# Altium footprint library HidroanaPCBLib1.PcbLib: 88 footprints (part 3 of 6)
Each footprint in its own frame and in the unit in brackets; x right, y up, seen from the top. Pads: shape width x height; smd on the part's side, far side on the other; paste and mask are expansions set on the pad; w line width, h text height; cw(c..) or ccw(c..) is an arc to the next point about the centre after c.
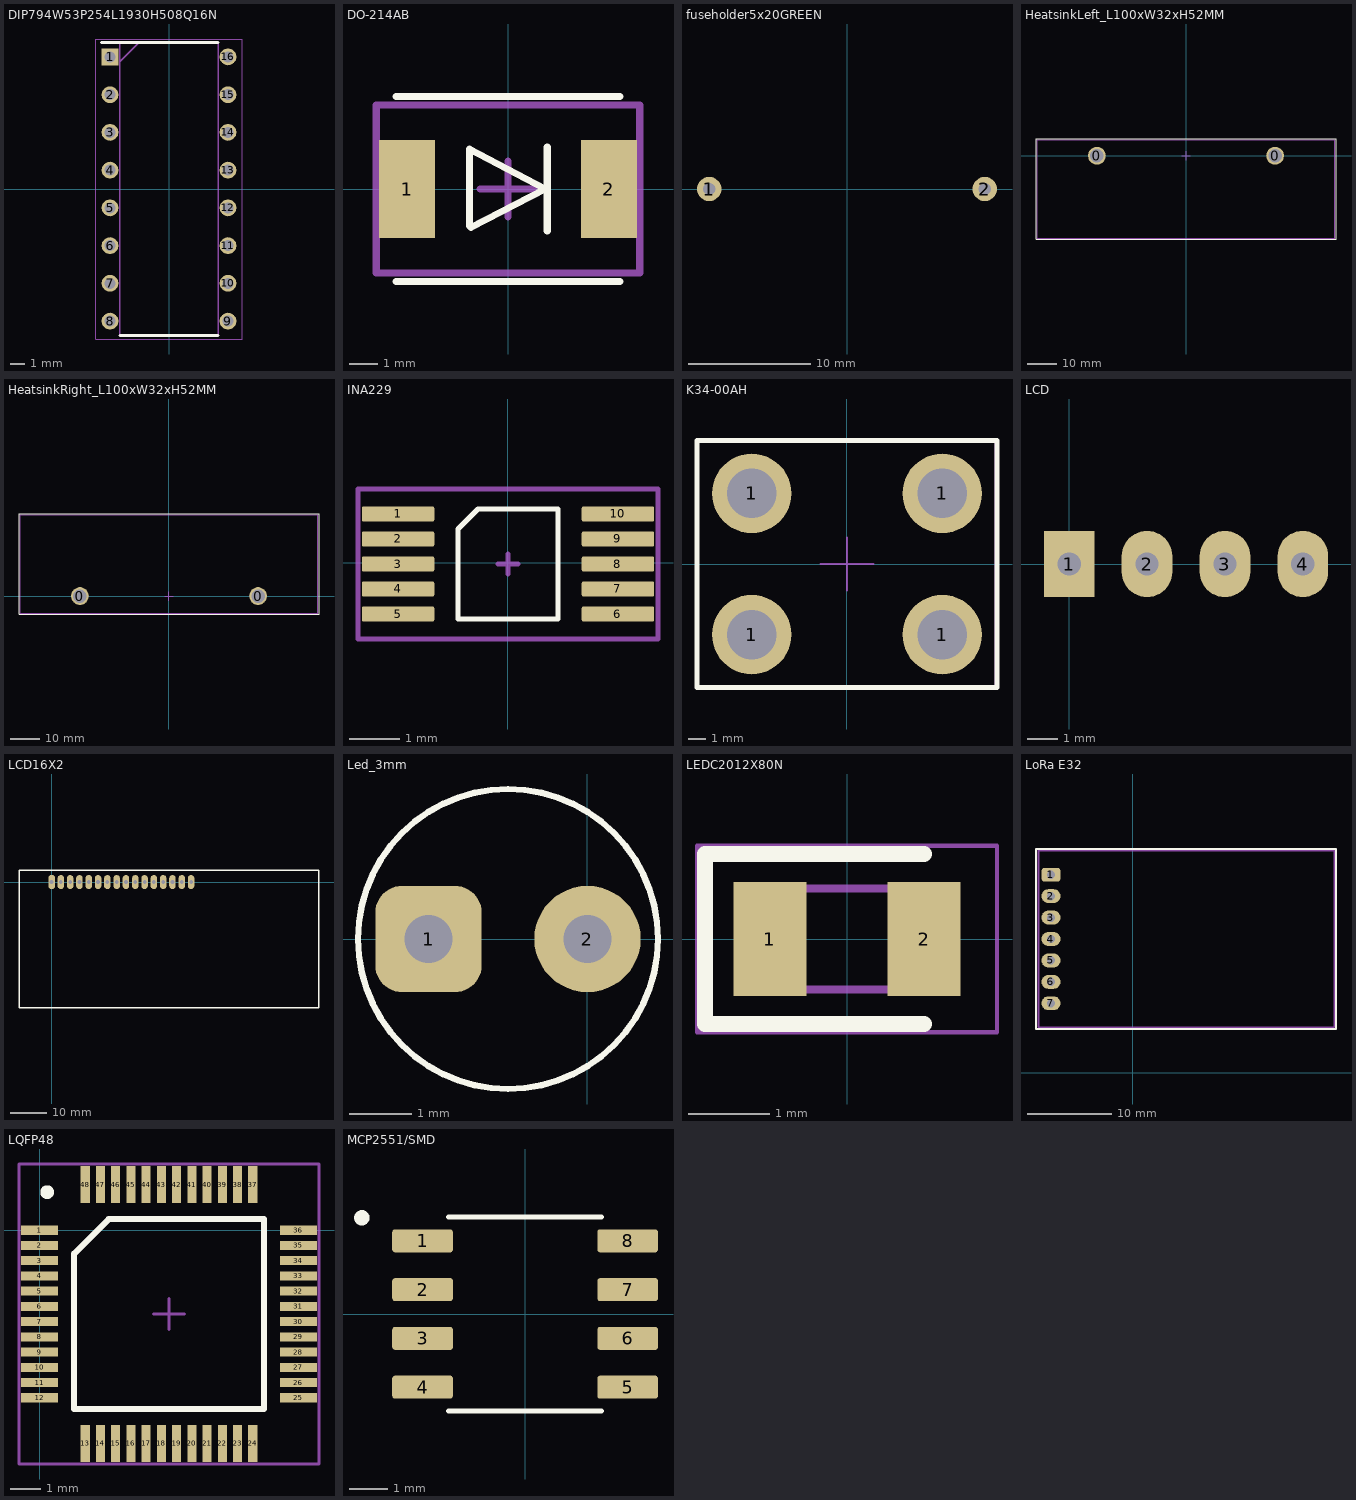
[diagram p2: the footprints below, top view; thin cyan lines are the x and y axes]

## DIP794W53P254L1930H508Q16N [mm]
pads (16):
  rect 1.13x1.13 hole 0.73: 1(-3.97,8.89)
  round 1.13 hole 0.73: 2(-3.97,6.35) 3(-3.97,3.81) 4(-3.97,1.27) 5(-3.97,-1.27) 6(-3.97,-3.81) 7(-3.97,-6.35) 8(-3.97,-8.89) 9(3.97,-8.89) 10(3.97,-6.35) 11(3.97,-3.81) 12(3.97,-1.27) 13(3.97,1.27) 14(3.97,3.81) 15(3.97,6.35) 16(3.97,8.89)
Top Overlay:
  lines w0.2: -4.535,9.845 3.3,9.845 ; -3.3,-9.845 3.3,-9.845
Top Component Center:
  lines w0.05: -4.945,-10.095 -4.945,10.095 4.945,10.095 4.945,-10.095 -4.945,-10.095
  lines w0.1: -3.3,8.575 -2.03,9.845 ; -3.3,-9.845 -3.3,9.845 3.3,9.845 3.3,-9.845 -3.3,-9.845
Top Designator:
  text ".Designator" at -7.364,-0.508 h1.52
3D body "TL494CN.stp": height 5.27, standoff -3.1, extent -3.937,-9.842 3.937,9.842

## Distance 11mm [mm]
via 0,0 diameter 3.2 hole 3.2
3D body "Download_STEP_970110321 (rev1).stp": height 11, standoff 0, extent -3.175,-2.75 3.176,2.75

## DO-214AB [mm]
pads (2):
  rect 2x3.5 smd mask+0.05: 1(-3.6,0) 2(3.6,0)
Top Overlay:
  lines w0.254: -4,-3.3 4,-3.3 ; -4,3.3 4,3.3 ; -1.375,-1.325 -1.375,1.425 1.325,0 -1.325,-1.375 ; 1.4,-1.5 1.4,1.5
Top Component Center:
  lines w0.254: -1,0 1,0 ; 0,-1 0,1 ; -4.7,-3 4.7,-3 4.7,3 -4.7,3 -4.7,-3
3D body "SS36.STEP": height 2.5, standoff 0, extent -3.95,-2.9 3.95,2.9

## fuseholder5x20GREEN [mm]
pads (2):
  round 2 hole 1 mask+0.05: 1(-11.3,0) 2(11.3,0)
Top Designator:
  text ".Designator" at -2.859,-0.287 h1.27
3D body "5x20fuseholder.step": height 13.5, standoff -3.5, extent -12.174,-4.637 12.226,4.763

## HeatsinkLeft_L100xW32xH52MM [mm] "Cooler Block"
pads (2):
  round 6 hole 4.5 mask+0.102: 0(-30,0) 0(30,0)
Top Overlay:
  lines w0.254: -50.5,-28.2 50.5,-28.2 50.5,5.8 -50.5,5.8 -50.5,-28.2
Top Component Center:
  lines w0.05: -50,-27.7 50,-27.7 50,5.3 -50,5.3 -50,-27.7
  lines w0.1: -1.5,0 1.5,0 ; 0,-1.5 0,1.5
Top Designator:
  text ".Designator" at -2.859,-0.287 h1.27
3D body "Soðutucu Blok sað30.SLDPRT": height 57, standoff 0, extent -50,-27.7 50,5.3

## HeatsinkRight_L100xW32xH52MM [mm] "Cooler Block"
pads (2):
  round 6 hole 4.5 mask+0.102: 0(-30,0) 0(30,0)
Top Overlay:
  lines w0.254: -50.5,-6.2 50.5,-6.2 50.5,27.8 -50.5,27.8 -50.5,-6.2
Top Component Center:
  lines w0.05: -50,-5.7 50,-5.7 50,27.3 -50,27.3 -50,-5.7
  lines w0.1: -1.5,0 1.5,0 ; 0,-1.5 0,1.5
Top Designator:
  text ".Designator" at -2.859,-0.287 h1.27
3D body "Soðutucu Blok sol 30.SLDPRT": height 57, standoff 0, extent -50,-5.7 50,27.3

## INA229 [mm] "DGS0010A"
height 11
pads (10):
  rrect20% 1.45x0.3 smd mask+0.05: 1(-2.2,0.975) 2(-2.2,0.475) 3(-2.2,-0.025) 4(-2.2,-0.525) 5(-2.2,-1.025) 6(2.2,-1.025) 7(2.2,-0.525) 8(2.2,-0.025) 9(2.2,0.475) 10(2.2,0.975)
Top Overlay:
  lines w0.1: -1,-1.125 -1,0.675 -0.6,1.075 1,1.075 1,-1.125 -1,-1.125
Top Component Center:
  lines w0.1: -0.2,-0.025 0.2,-0.025 ; 0,-0.225 0,0.175 ; -3,-1.525 3,-1.525 3,1.475 -3,1.475 -3,-1.525
Top Designator:
  text ".Designator" at -2.757,-0.236 h1.27
3D body "User Library-DGS0010A.STEP": height 1.1, standoff 0, extent -2.462,-1.525 2.463,1.475

## K34-00AH [mm]
pads (4):
  round 4.5 hole 2.8: 1(-5.4,-4) 1(-5.4,4) 1(5.4,-4) 1(5.4,4)
Top Overlay:
  lines w0.3: -8.5,-7 8.5,-7 8.5,7 -8.5,7 -8.5,-7
Top Component Center:
  lines w0.05: -8.398,-6.898 8.399,-6.898 8.399,6.899 -8.398,6.899 -8.398,-6.898
  lines w0.1: -1.5,0 1.5,0 ; 0,-1.5 0,1.5
Top Designator:
  text ".Designator" at -2.859,-0.287 h1.27
3D body "terminal_K34.STEP": height 7.5, standoff -4.5, extent -6,-5 6,5

## LCD [mil]
pads (4):
  rect 65x85 hole 30 mask+1.97: 1(0,0)
  oval 65x85 hole 30 mask+1.97: 2(100,0) 3(200,0) 4(300,0)
3D body "LCD AP214.STEP": height 785.83, standoff -104.92, extent -298.1,-313.26 1119.23,2836.34

## LCD16X2 [mm]
pads (16):
  oct 1.778x3.81 hole 1: 1(0,0)
  oval 1.778x3.81 hole 1: 2(2.54,0) 3(5.08,0) 4(7.62,0) 5(10.16,0) 6(12.7,0) 7(15.24,0) 8(17.78,0) 9(20.32,0) 10(22.86,0) 11(25.4,0) 12(27.94,0) 13(30.48,0) 14(33.02,0) 15(35.56,0) 16(38.1,0)
Top Overlay:
  lines w0.4: -8.89,-34.29 73.025,-34.29 73.025,3.175 -8.89,3.175 -8.89,-34.29
Top Designator:
  text ".Designator" at 23.624,-16.002 h1.52
3D body "User Library-LCD-5.STEP": height 12.8, standoff -5.5, extent -8.005,-33.53 71.995,2.47

## Led_3mm [mm]
pads (2):
  rrect50% 1.7x1.7 hole 0.762 mask+0.102: 1(-2.54,0)
  round 1.7 hole 0.762 mask+0.102: 2(0,0)
Top Overlay:
  circle w0.1: c-1.27,0 r2.396
Top Designator:
  text ".Designator" at -8.888,-0.508 h1.52
3D body "led_3mm.step": height 7.01, standoff -1.49, extent -2.9,-1.9 0.6,1.9

## LEDC2012X80N [mm]
pads (2):
  rect 0.9x1.4 smd: 1(-0.95,0) 2(0.95,0)
Top Overlay:
  lines w0.2: 0.95,-1.05 -1.75,-1.05 -1.75,1.05 0.95,1.05
Top Component Center:
  lines w0.05: -1.85,-1.15 -1.85,1.15 1.85,1.15 1.85,-1.15 -1.85,-1.15
  lines w0.1: -1,0.208 -0.583,0.625 ; -1,-0.625 -1,0.625 1,0.625 1,-0.625 -1,-0.625
Top Designator:
  text ".Designator" at -7.872,-0.508 h1.52
3D body "150080BS75000.stp": height 0.7, standoff 0, extent -1.03,-0.625 0.97,0.625

## LoRa E32 [mm]
pads (7):
  rrect50% 2.286x1.651 hole 1: 1(-9.7,23.5)
  oval 2.286x1.651 hole 1: 2(-9.7,20.96) 3(-9.7,18.42) 4(-9.7,15.88) 5(-9.7,13.34) 6(-9.7,10.8) 7(-9.7,8.26)
Top Overlay:
  lines w0.254: -11.478,5.212 24.1,5.212 24.1,26.548 -11.478,26.548 -11.478,5.212
Top Component Center:
  lines w0.2: -11.173,5.427 23.9,5.427 23.9,26.373 -11.173,26.373 -11.173,5.427
Top Designator:
  text ".Designator" at 7.064,22.99 h1.52
3D body "E32-433T20DT.stp": height 7.9, standoff -5.72, extent -11.163,5.385 37.337,26.385

## LQFP48 [mm]
pads (48):
  rect 1.2x0.3 smd mask+0.127: 1(0,0) 2(0,-0.5) 3(0,-1) 4(0,-1.5) 5(0,-2) 6(0,-2.5) 7(0,-3) 8(0,-3.5) 9(0,-4) 10(0,-4.5) 11(0,-5) 12(0,-5.5) 25(8.5,-5.5) 26(8.5,-5) 27(8.5,-4.5) 28(8.5,-4) 29(8.5,-3.5) 30(8.5,-3) 31(8.5,-2.5) 32(8.5,-2) 33(8.5,-1.5) 34(8.5,-1) 35(8.5,-0.5) 36(8.5,0)
  rect 0.3x1.2 smd mask+0.127: 13(1.5,-7) 14(2,-7) 15(2.5,-7) 16(3,-7) 17(3.5,-7) 18(4,-7) 19(4.5,-7) 20(5,-7) 21(5.5,-7) 22(6,-7) 23(6.5,-7) 24(7,-7) 37(7,1.5) 38(6.5,1.5) 39(6,1.5) 40(5.5,1.5) 41(5,1.5) 42(4.5,1.5) 43(4,1.5) 44(3.5,1.5) 45(3,1.5) 46(2.5,1.5) 47(2,1.5) 48(1.5,1.5)
Top Overlay:
  circle w0.254: c0.25,1.25 r0.099
  lines w0.2: 1.135,-5.865 1.135,-0.77 2.27,0.365 7.365,0.365 7.365,-5.865 1.135,-5.865
Top Component Center:
  lines w0.1: 3.75,-2.75 4.75,-2.75 ; 4.25,-3.25 4.25,-2.25 ; -0.673,-7.673 9.173,-7.673 9.173,2.173 -0.673,2.173 -0.673,-7.673
Top Designator:
  text ".Designator" at 1,-2.964 h1.52
3D body "LQFP48.STEP": height 1.6, standoff 0, extent -0.25,-7.25 8.75,1.75

## MCP2551/SMD [mm]
pads (8):
  rrect25% 1.58x0.6 smd: 1(-2.67,1.905) 2(-2.67,0.635) 3(-2.67,-0.635) 4(-2.67,-1.905) 5(2.67,-1.905) 6(2.67,-0.635) 7(2.67,0.635) 8(2.67,1.905)
Top Overlay:
  circle w0.2: c-4.25,2.505 r0.1
  lines w0.127: -1.995,-2.525 1.995,-2.525 ; -1.995,2.525 1.995,2.525
3D body "MCP2551-I_SN.STEP": height 1.75, standoff 0, extent -3.051,-2.45 2.949,2.45

## mcu [mm]
3D body "PCB3.step": height 31.4, standoff 11.14, extent -1.351,-0.508 64.343,31.492